# Altium footprint library Cty1.PcbLib: 1378 footprints (part 4 of 87)
Each footprint in its own frame and in the unit in brackets; x right, y up, seen from the top. Pads: shape width x height; smd on the part's side, far side on the other; paste and mask are expansions set on the pad; w line width, h text height; cw(c..) or ccw(c..) is an arc to the next point about the centre after c.
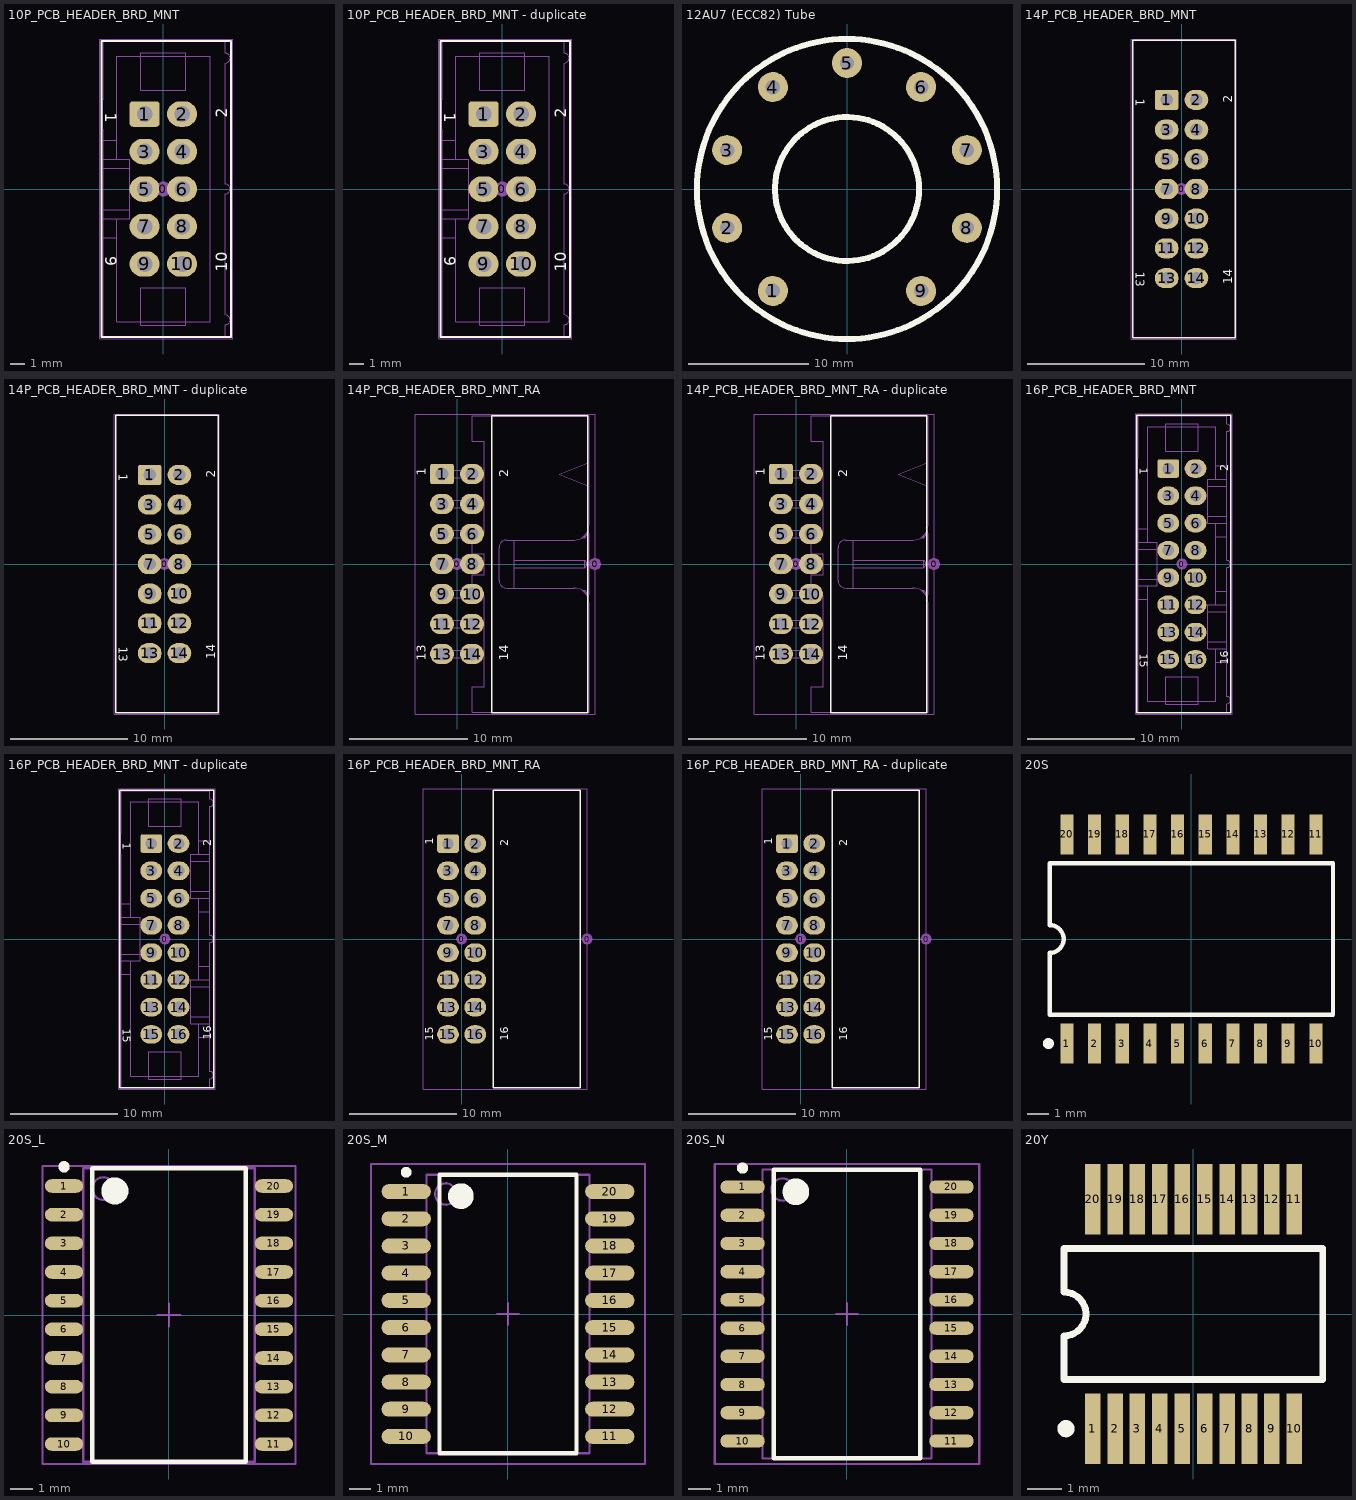
[diagram p3: the footprints below, top view; thin cyan lines are the x and y axes]

## 10P_PCB_HEADER_BRD_MNT [mil] "HEADER BRD MNT 10POS 2.54MM"
height 390
pads (11):
  round 40 on Mech15: 0(0,0)
  rrect25% 80x68 hole 42: 1(-50,200)
  oval 80x68 hole 42: 2(50,200) 3(-50,100) 4(50,100) 5(-50,0) 6(50,0) 7(-50,-100) 8(50,-100) 9(-50,-200) 10(50,-200)
Top Overlay:
  lines w5: -165,-395 -165,395 180,395 180,-395 -165,-395
  text "2" at 170,190 h30
  text "1" at -155,203.57 h30
  text "10" at 170,-220.28 h30
  text "9" at -155,-179 h30
Mechanical 13:
  drawing of 154 lines, arcs and shapes, not listed
Mechanical 15:
  lines w3: -170,-400 -170,400 185,400 185,-400 -170,-400
3D body "D2510-6002-AR (10P).STEP": height 390, standoff -120, extent -161.99,-393.99 178.01,394.01

## 10P_PCB_HEADER_BRD_MNT - duplicate [mil] "HEADER BRD MNT 10POS 2.54MM"
height 390
pads (11):
  round 40 on Mech15: 0(0,0)
  rrect25% 80x68 hole 42: 1(-50,200)
  oval 80x68 hole 42: 2(50,200) 3(-50,100) 4(50,100) 5(-50,0) 6(50,0) 7(-50,-100) 8(50,-100) 9(-50,-200) 10(50,-200)
Top Overlay:
  lines w5: -165,-395 180,-395 180,395 -165,395 -165,-395
  text "9" at -155,-179 h30
  text "10" at 170,-220.28 h30
  text "1" at -155,203.57 h30
  text "2" at 170,190 h30
Mechanical 13:
  drawing of 154 lines, arcs and shapes, not listed
Mechanical 15:
  lines w3: -170,-400 185,-400 185,400 -170,400 -170,-400
3D body "D2510-6002-AR (10P).STEP": height 390, standoff -120, extent -161.99,-393.99 178.01,394.01

## 12AU7 (ECC82) Tube [mm]
pads (9):
  round 2.5 hole 1.2: 1(-6.172,-8.495) 2(-9.986,-3.245) 3(-9.986,3.245) 4(-6.172,8.495) 5(0,10.5) 6(6.172,8.495) 7(9.986,3.245) 8(9.986,-3.245) 9(6.172,-8.495)
Top Overlay:
  circle w0.5: c0,0 r12.5
  circle w0.5: c0,0 r6
3D body "Part26.STEP": height 70.12, standoff -5.7, extent -12.5,-12.5 12.5,12.5

## 14P_PCB_HEADER_BRD_MNT [mil] "HEADER BRD MNT 14POS 2.54MM"
height 390
pads (15):
  round 40 on Mech15: 0(0,0)
  rrect25% 80x68 hole 42: 1(-50,300)
  oval 80x68 hole 42: 2(50,300) 3(-50,200) 4(50,200) 5(-50,100) 6(50,100) 7(-50,0) 8(50,0) 9(-50,-100) 10(50,-100) 11(-50,-200) 12(50,-200) 13(-50,-300) 14(50,-300)
Top Overlay:
  lines w5: -165,-500 180,-500 180,500 -165,500 -165,-500
  text "13" at -155,-279 h30
  text "14" at 170,-320.28 h30
  text "1" at -155,303.57 h30
  text "2" at 170,290 h30
Mechanical 15:
  lines w3: -170,-505 185,-505 185,505 -170,505 -170,-505
3D body "D2514-6002-AR (14P).STEP": height 390, standoff -120, extent -161.99,-493.99 178.01,494.01

## 14P_PCB_HEADER_BRD_MNT - duplicate [mil] "HEADER BRD MNT 14POS 2.54MM"
height 390
pads (15):
  round 40 on Mech15: 0(0,0)
  rrect25% 80x68 hole 42: 1(-50,300)
  oval 80x68 hole 42: 2(50,300) 3(-50,200) 4(50,200) 5(-50,100) 6(50,100) 7(-50,0) 8(50,0) 9(-50,-100) 10(50,-100) 11(-50,-200) 12(50,-200) 13(-50,-300) 14(50,-300)
Top Overlay:
  lines w5: -165,-500 180,-500 180,500 -165,500 -165,-500
  text "13" at -155,-279 h30
  text "14" at 170,-320.28 h30
  text "1" at -155,303.57 h30
  text "2" at 170,290 h30
Mechanical 15:
  lines w3: -170,-505 185,-505 185,505 -170,505 -170,-505
3D body "D2514-6002-AR (14P).STEP": height 390, standoff -120, extent -161.99,-493.99 178.01,494.01

## 14P_PCB_HEADER_BRD_MNT_RA [mil] "HEADER BRD MNT R/A 14POS 2.54MM"
height 338
pads (16):
  round 40 on Mech15: 0(0,0) 0(460,0)
  rrect25% 80x68 hole 42: 1(-50,300)
  oval 80x68 hole 42: 2(50,300) 3(-50,200) 4(50,200) 5(-50,100) 6(50,100) 7(-50,0) 8(50,0) 9(-50,-100) 10(50,-100) 11(-50,-200) 12(50,-200) 13(-50,-300) 14(50,-300)
Top Overlay:
  lines w5: 115,-495 435,-495 435,495 115,495 115,-495
  text "13" at -105,-323 h30
  text "14" at 170,-323 h30
  text "1" at -105,295 h30
  text "2" at 170,290 h30
Mechanical 13:
  lines w1.97: -17.5,-312.25 -17.5,-287.75 ; -17.5,-212.25 -17.5,-187.75 ; -17.5,-112.25 -17.5,-87.75 ; -17.5,-12.25 -17.5,12.25 ; -17.5,87.75 -17.5,112.25 ; -17.5,187.75 -17.5,212.25 ; -17.5,287.75 -17.5,312.25 ; 50,-87.75 -62.5,-87.75 -62.5,-112.25 90,-112.25 ; 50,87.75 -62.5,87.75 -62.5,112.25 90,112.25 ; 90,-312.25 -62.5,-312.25 -62.5,-287.75 90,-287.75 ; 90,-212.25 -62.5,-212.25 -62.5,-187.75 90,-187.75 ; 90,-12.25 -62.5,-12.25 -62.5,12.25 90,12.25 ; 90,187.75 -62.5,187.75 -62.5,212.25 90,212.25 ; 90,287.75 -62.5,287.75 -62.5,312.25 90,312.25 ; 190,-80 190,80 ; 190,-12.25 425,-12.25 ; 190,12.25 425,12.25 ; 416.74,-87.75 425,-87.75 ; 416.74,87.75 425,87.75 ; 425,-94.29 425,-87.75 ; 425,94.29 425,87.75 ; 433,-104.25 433,-95.75 425,-87.75 ; 433,104.25 433,95.75 425,87.75 ; 437.7,-115 ccw(c390,-100) 440,-100 440,100 ccw(c390,100) 437.7,115 ; 440,260 340,300 440,340 ; 425,-12.25 433,-4.25 433,4.25 425,12.25 ; 425,-12.25 425,12.25 ; 50,-494 50,-409 90,-409 90,-105 50,-105 50,-35 90,-35 90,35 50,35 50,105 90,105 90,409 50,409 50,494 440,494 440,130 cw(c390,130) 390,80 165,80 ccw(c165,55) 140,55 140,-55 ccw(c165,-55) 165,-80 390,-80 cw(c390,-130) 440,-130 440,-494 50,-494
Mechanical 15:
  lines w3: -140,-500 460,-500 460,500 -140,500 -140,-500
3D body "D2514-5002-AR (14P_RA).STEP": height 340, standoff -112, extent -62.49,-493.99 440.01,494.01

## 14P_PCB_HEADER_BRD_MNT_RA - duplicate [mil] "HEADER BRD MNT R/A 14POS 2.54MM"
height 338
pads (16):
  round 40 on Mech15: 0(0,0) 0(460,0)
  rrect25% 80x68 hole 42: 1(-50,300)
  oval 80x68 hole 42: 2(50,300) 3(-50,200) 4(50,200) 5(-50,100) 6(50,100) 7(-50,0) 8(50,0) 9(-50,-100) 10(50,-100) 11(-50,-200) 12(50,-200) 13(-50,-300) 14(50,-300)
Top Overlay:
  lines w5: 115,-495 115,495 435,495 435,-495 115,-495
  text "2" at 170,290 h30
  text "1" at -105,295 h30
  text "14" at 170,-323 h30
  text "13" at -105,-323 h30
Mechanical 13:
  lines w1.97: -17.5,-312.25 -17.5,-287.75 ; -17.5,-212.25 -17.5,-187.75 ; -17.5,-112.25 -17.5,-87.75 ; -17.5,-12.25 -17.5,12.25 ; -17.5,87.75 -17.5,112.25 ; -17.5,187.75 -17.5,212.25 ; -17.5,287.75 -17.5,312.25 ; 50,-87.75 -62.5,-87.75 -62.5,-112.25 90,-112.25 ; 50,87.75 -62.5,87.75 -62.5,112.25 90,112.25 ; 90,-312.25 -62.5,-312.25 -62.5,-287.75 90,-287.75 ; 90,-212.25 -62.5,-212.25 -62.5,-187.75 90,-187.75 ; 90,-12.25 -62.5,-12.25 -62.5,12.25 90,12.25 ; 90,187.75 -62.5,187.75 -62.5,212.25 90,212.25 ; 90,287.75 -62.5,287.75 -62.5,312.25 90,312.25 ; 190,-80 190,80 ; 190,-12.25 425,-12.25 ; 190,12.25 425,12.25 ; 416.74,-87.75 425,-87.75 ; 416.74,87.75 425,87.75 ; 425,-94.29 425,-87.75 ; 425,94.29 425,87.75 ; 433,-104.25 433,-95.75 425,-87.75 ; 433,104.25 433,95.75 425,87.75 ; 437.7,-115 ccw(c390,-100) 440,-100 440,100 ccw(c390,100) 437.7,115 ; 440,260 340,300 440,340 ; 425,-12.25 425,12.25 ; 425,-12.25 433,-4.25 433,4.25 425,12.25 ; 50,-494 440,-494 440,-130 ccw(c390,-130) 390,-80 165,-80 cw(c165,-55) 140,-55 140,55 cw(c165,55) 165,80 390,80 ccw(c390,130) 440,130 440,494 50,494 50,409 90,409 90,105 50,105 50,35 90,35 90,-35 50,-35 50,-105 90,-105 90,-409 50,-409 50,-494
Mechanical 15:
  lines w3: -140,-500 -140,500 460,500 460,-500 -140,-500
3D body "D2514-5002-AR (14P_RA).STEP": height 340, standoff -112, extent -62.49,-493.99 440.01,494.01

## 16P_PCB_HEADER_BRD_MNT [mil] "HEADER BRD MNT 16POS 2.54MM"
height 390
pads (17):
  round 40 on Mech15: 0(0,0)
  rrect25% 80x68 hole 42: 1(-50,350)
  oval 80x68 hole 42: 2(50,350) 3(-50,250) 4(50,250) 5(-50,150) 6(50,150) 7(-50,50) 8(50,50) 9(-50,-50) 10(50,-50) 11(-50,-150) 12(50,-150) 13(-50,-250) 14(50,-250) 15(-50,-350) 16(50,-350)
Top Overlay:
  lines w5: -165,-545 180,-545 180,545 -165,545 -165,-545
  text "15" at -155,-329 h30
  text "16" at 170,-370.28 h30
  text "1" at -155,353.57 h30
  text "2" at 170,340 h30
Mechanical 13:
  drawing of 242 lines, arcs and shapes, not listed
Mechanical 15:
  lines w3: -170,-550 185,-550 185,550 -170,550 -170,-550
3D body "D2516-6002-AR (16P).STEP": height 390, standoff -120, extent -161.99,-543.99 178.01,544.01

## 16P_PCB_HEADER_BRD_MNT - duplicate [mil] "HEADER BRD MNT 16POS 2.54MM"
height 390
pads (17):
  round 40 on Mech15: 0(0,0)
  rrect25% 80x68 hole 42: 1(-50,350)
  oval 80x68 hole 42: 2(50,350) 3(-50,250) 4(50,250) 5(-50,150) 6(50,150) 7(-50,50) 8(50,50) 9(-50,-50) 10(50,-50) 11(-50,-150) 12(50,-150) 13(-50,-250) 14(50,-250) 15(-50,-350) 16(50,-350)
Top Overlay:
  lines w5: -165,-545 180,-545 180,545 -165,545 -165,-545
  text "15" at -155,-329 h30
  text "16" at 170,-370.28 h30
  text "1" at -155,353.57 h30
  text "2" at 170,340 h30
Mechanical 13:
  drawing of 242 lines, arcs and shapes, not listed
Mechanical 15:
  lines w3: -170,-550 185,-550 185,550 -170,550 -170,-550
3D body "D2516-6002-AR (16P).STEP": height 390, standoff -120, extent -161.99,-543.99 178.01,544.01

## 16P_PCB_HEADER_BRD_MNT_RA [mil] "HEADER BRD MNT R/A 16POS 2.54MM"
height 338
pads (18):
  round 40 on Mech15: 0(0,0) 0(460,0)
  rrect25% 80x68 hole 42: 1(-50,350)
  oval 80x68 hole 42: 2(50,350) 3(-50,250) 4(50,250) 5(-50,150) 6(50,150) 7(-50,50) 8(50,50) 9(-50,-50) 10(50,-50) 11(-50,-150) 12(50,-150) 13(-50,-250) 14(50,-250) 15(-50,-350) 16(50,-350)
Top Overlay:
  lines w5: 115,-545 115,545 435,545 435,-545 115,-545
  text "2" at 170,340 h30
  text "1" at -105,345 h30
  text "16" at 170,-373 h30
  text "15" at -105,-373 h30
Mechanical 15:
  lines w3: -140,-550 -140,550 460,550 460,-550 -140,-550
3D body "Box Header 3M 2516_RA.STEP": height 340, standoff -112, extent -62.24,-543.99 440.01,544.01

## 16P_PCB_HEADER_BRD_MNT_RA - duplicate [mil] "HEADER BRD MNT R/A 16POS 2.54MM"
height 338
pads (18):
  round 40 on Mech15: 0(0,0) 0(460,0)
  rrect25% 80x68 hole 42: 1(-50,350)
  oval 80x68 hole 42: 2(50,350) 3(-50,250) 4(50,250) 5(-50,150) 6(50,150) 7(-50,50) 8(50,50) 9(-50,-50) 10(50,-50) 11(-50,-150) 12(50,-150) 13(-50,-250) 14(50,-250) 15(-50,-350) 16(50,-350)
Top Overlay:
  lines w5: 115,-545 115,545 435,545 435,-545 115,-545
  text "2" at 170,340 h30
  text "1" at -105,345 h30
  text "16" at 170,-373 h30
  text "15" at -105,-373 h30
Mechanical 15:
  lines w3: -140,-550 -140,550 460,550 460,-550 -140,-550
3D body "Box Header 3M 2516_RA.STEP": height 340, standoff -112, extent -62.24,-543.99 440.01,544.01

## 20S [mm] "Small Outline; 20 Leads; Body Width 7.5 mm; Pitch 1.27 mm"
height 2.67
pads (20):
  rect 0.6x1.85 smd: 1(-5.715,-4.8) 2(-4.445,-4.8) 3(-3.175,-4.8) 4(-1.905,-4.8) 5(-0.635,-4.8) 6(0.635,-4.8) 7(1.905,-4.8) 8(3.175,-4.8) 9(4.445,-4.8) 10(5.715,-4.8) 11(5.715,4.8) 12(4.445,4.8) 13(3.175,4.8) 14(1.905,4.8) 15(0.635,4.8) 16(-0.635,4.8) 17(-1.905,4.8) 18(-3.175,4.8) 19(-4.445,4.8) 20(-5.715,4.8)
Top Overlay:
  circle w0.25: c-6.565,-4.8 r0.125
  lines w0.2: -6.5,-3.475 -6.5,-0.635 ccw(c-6.5,0) -6.5,0.635 -6.5,3.475 6.5,3.475 6.5,-3.475 -6.5,-3.475

## 20S_L [mm] "SOIC, 20-Leads, Body 12.8x7.5mm, Pitch 1.27mm, IPC High Density"
height 2.67
pads (20):
  oval 1.7x0.6 smd: 1(-4.65,5.715) 2(-4.65,4.445) 3(-4.65,3.175) 4(-4.65,1.905) 5(-4.65,0.635) 6(-4.65,-0.635) 7(-4.65,-1.905) 8(-4.65,-3.175) 9(-4.65,-4.445) 10(-4.65,-5.715) 11(4.65,-5.715) 12(4.65,-4.445) 13(4.65,-3.175) 14(4.65,-1.905) 15(4.65,-0.635) 16(4.65,0.635) 17(4.65,1.905) 18(4.65,3.175) 19(4.65,4.445) 20(4.65,5.715)
Top Overlay:
  circle w0.25: c-4.65,6.565 r0.125
  circle w0.6: c-2.4,5.5 r0.3
  lines w0.2: -3.4,-6.5 -3.4,6.5 3.4,6.5 3.4,-6.5 -3.4,-6.5
Mechanical 13:
  circle w0.1: c-2.9,5.6 r0.5
  lines w0.1: -3.8,-6.5 -3.8,6.5 3.8,6.5 3.8,-6.5 -3.8,-6.5
Mechanical 15:
  lines w0.1: -0.5,0 0.5,0 ; 0,-0.5 0,0.5 ; -5.6,-6.6 -5.6,6.6 5.6,6.6 5.6,-6.6 -5.6,-6.6

## 20S_M [mm] "SOIC, 20-Leads, Body 12.8x7.5mm, Pitch 1.27mm, IPC Low Density"
height 2.67
pads (20):
  oval 2.3x0.7 smd: 1(-4.75,5.715) 2(-4.75,4.445) 3(-4.75,3.175) 4(-4.75,1.905) 5(-4.75,0.635) 6(-4.75,-0.635) 7(-4.75,-1.905) 8(-4.75,-3.175) 9(-4.75,-4.445) 10(-4.75,-5.715) 11(4.75,-5.715) 12(4.75,-4.445) 13(4.75,-3.175) 14(4.75,-1.905) 15(4.75,-0.635) 16(4.75,0.635) 17(4.75,1.905) 18(4.75,3.175) 19(4.75,4.445) 20(4.75,5.715)
Top Overlay:
  circle w0.6: c-2.2,5.5 r0.3
  circle w0.25: c-4.75,6.615 r0.125
  lines w0.2: -3.2,-6.5 3.2,-6.5 3.2,6.5 -3.2,6.5 -3.2,-6.5
Mechanical 13:
  circle w0.1: c-2.9,5.6 r0.5
  lines w0.1: -3.8,-6.5 3.8,-6.5 3.8,6.5 -3.8,6.5 -3.8,-6.5
Mechanical 15:
  lines w0.1: -0.5,0 0.5,0 ; 0,-0.5 0,0.5 ; -6.4,-7 6.4,-7 6.4,7 -6.4,7 -6.4,-7

## 20S_N [mm] "SOIC, 20-Leads, Body 12.8x7.5mm, Pitch 1.27mm, IPC Medium Density"
height 2.67
pads (20):
  oval 2x0.6 smd: 1(-4.7,5.715) 2(-4.7,4.445) 3(-4.7,3.175) 4(-4.7,1.905) 5(-4.7,0.635) 6(-4.7,-0.635) 7(-4.7,-1.905) 8(-4.7,-3.175) 9(-4.7,-4.445) 10(-4.7,-5.715) 11(4.7,-5.715) 12(4.7,-4.445) 13(4.7,-3.175) 14(4.7,-1.905) 15(4.7,-0.635) 16(4.7,0.635) 17(4.7,1.905) 18(4.7,3.175) 19(4.7,4.445) 20(4.7,5.715)
Top Overlay:
  circle w0.25: c-4.7,6.565 r0.125
  circle w0.6: c-2.3,5.5 r0.3
  lines w0.2: -3.3,-6.5 -3.3,6.5 3.3,6.5 3.3,-6.5 -3.3,-6.5
Mechanical 13:
  circle w0.1: c-2.9,5.6 r0.5
  lines w0.1: -3.8,-6.5 -3.8,6.5 3.8,6.5 3.8,-6.5 -3.8,-6.5
Mechanical 15:
  lines w0.1: -0.5,0 0.5,0 ; 0,-0.5 0,0.5 ; -5.95,-6.75 -5.95,6.75 5.95,6.75 5.95,-6.75 -5.95,-6.75

## 20Y [mm] "SSOP; 20 Leads; Body Width 5.3 mm; Pitch 0.65 mm"
height 1.99
pads (20):
  rect 0.45x2.05 smd: 1(-2.925,-3.325) 2(-2.275,-3.325) 3(-1.625,-3.325) 4(-0.975,-3.325) 5(-0.325,-3.325) 6(0.325,-3.325) 7(0.975,-3.325) 8(1.625,-3.325) 9(2.275,-3.325) 10(2.925,-3.325) 11(2.925,3.325) 12(2.275,3.325) 13(1.625,3.325) 14(0.975,3.325) 15(0.325,3.325) 16(-0.325,3.325) 17(-0.975,3.325) 18(-1.625,3.325) 19(-2.275,3.325) 20(-2.925,3.325)
Top Overlay:
  circle w0.25: c-3.7,-3.325 r0.125
  lines w0.2: -3.75,-1.9 3.75,-1.9 3.75,1.9 -3.75,1.9 -3.75,0.633 cw(c-3.75,0) -3.75,-0.633 -3.75,-1.9